# Altium footprint library chipfc_libs.PCBLIB: 283 footprints (part 11 of 18)
Each footprint in its own frame and in the unit in brackets; x right, y up, seen from the top. Pads: shape width x height; smd on the part's side, far side on the other; paste and mask are expansions set on the pad; w line width, h text height; cw(c..) or ccw(c..) is an arc to the next point about the centre after c.
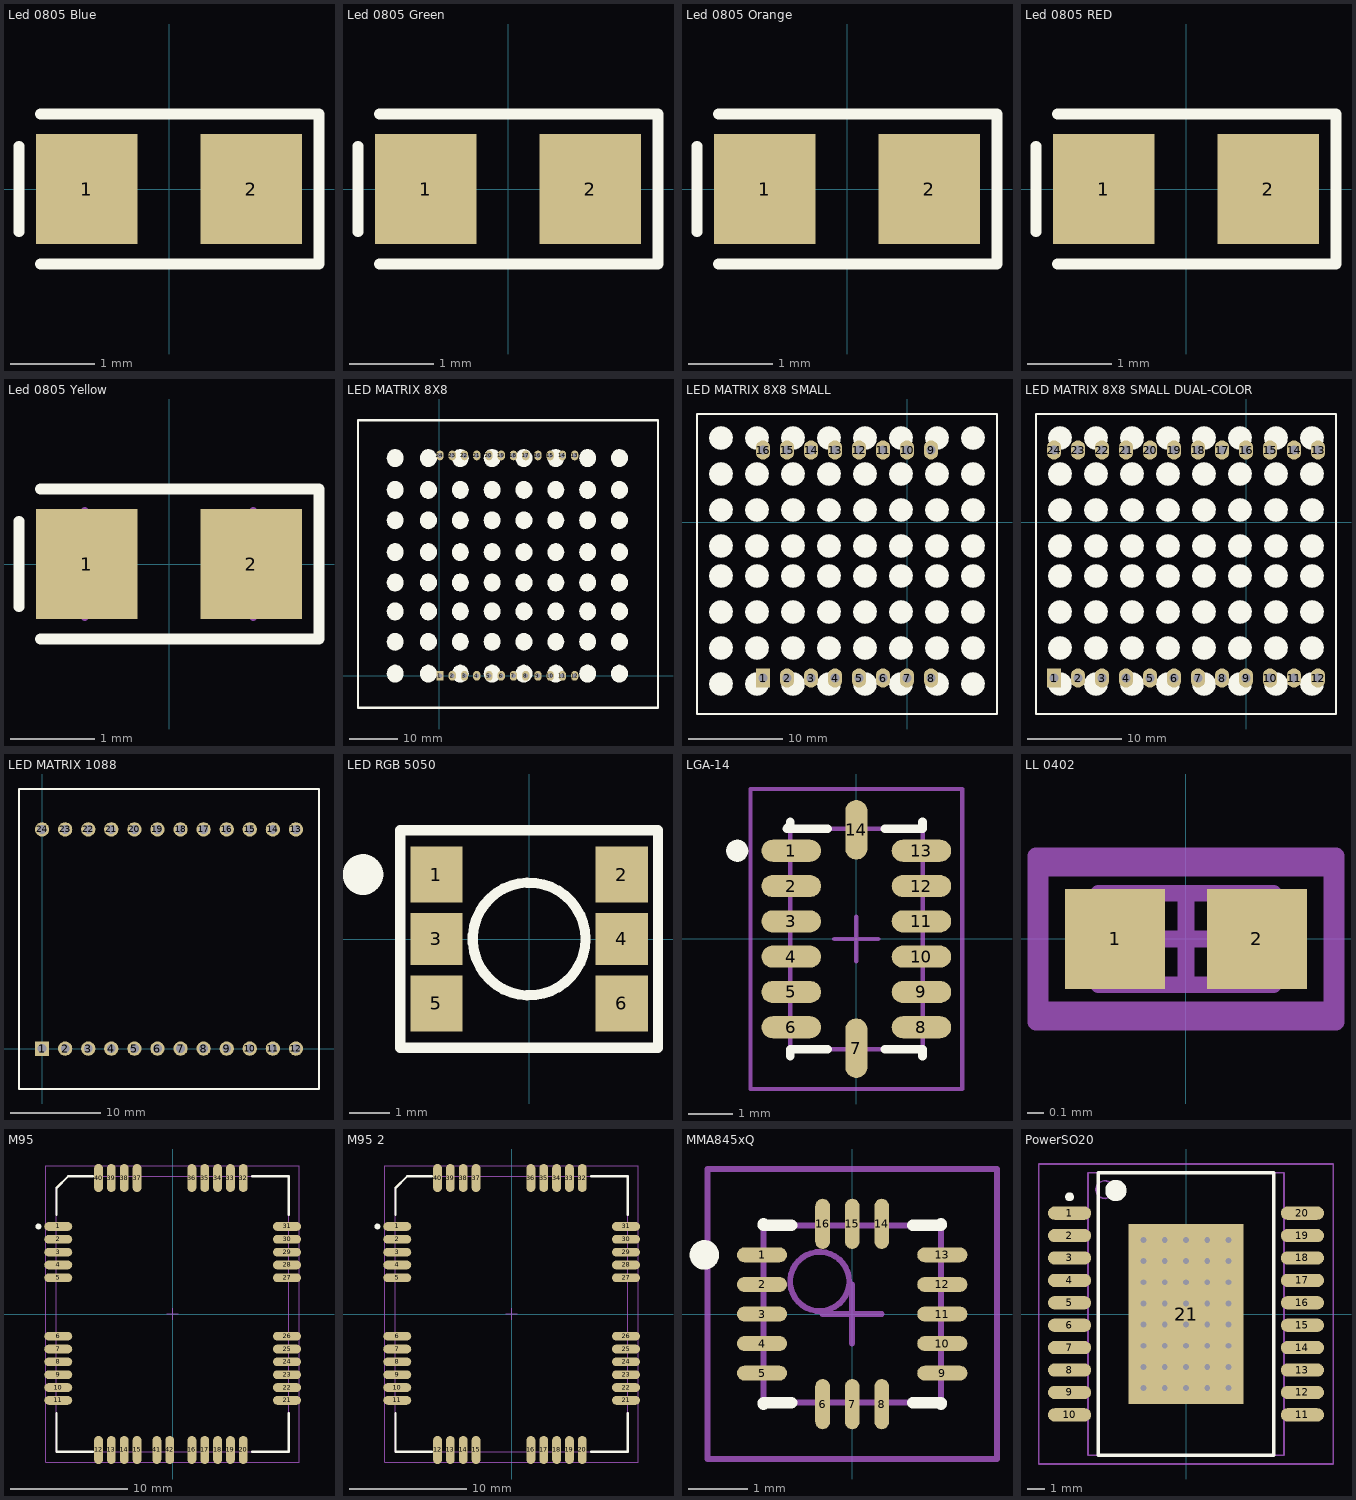
[diagram p10: the footprints below, top view; thin cyan lines are the x and y axes]

## Led 0805 Blue [mm] "Led SMD 0805"
height 1.1
pads (2):
  rect 1.2x1.3 smd: 1(-0.975,0) 2(0.975,0)
Top Overlay:
  lines w0.127: -1.778,-0.508 -1.778,0.508 ; -1.524,-0.889 1.778,-0.889 1.778,0.889 -1.524,0.889
3D body "User Library-led_0805-blue.step": height 1.1, standoff 0, extent -1.01,-0.625 1.01,0.625

## Led 0805 Green [mm] "Led SMD 0805"
height 1.1
pads (2):
  rect 1.2x1.3 smd: 1(-0.975,0) 2(0.975,0)
Top Overlay:
  lines w0.127: -1.778,-0.508 -1.778,0.508 ; -1.524,-0.889 1.778,-0.889 1.778,0.889 -1.524,0.889
3D body "User Library-led_0805-green.step": height 1.1, standoff 0, extent -1.01,-0.625 1.01,0.625

## Led 0805 Orange [mm] "Led SMD 0805"
height 1.1
pads (2):
  rect 1.2x1.3 smd: 1(-0.975,0) 2(0.975,0)
Top Overlay:
  lines w0.127: -1.778,-0.508 -1.778,0.508 ; -1.524,-0.889 1.778,-0.889 1.778,0.889 -1.524,0.889
3D body "User Library-led_0805-orange.step": height 1.1, standoff 0, extent -1.01,-0.625 1.01,0.625

## Led 0805 RED [mm] "Led SMD 0805"
height 1.1
pads (2):
  rect 1.2x1.3 smd: 1(-0.975,0) 2(0.975,0)
Top Overlay:
  lines w0.127: -1.778,-0.508 -1.778,0.508 ; -1.524,-0.889 1.778,-0.889 1.778,0.889 -1.524,0.889
3D body "User Library-led_0805-red.step": height 1.1, standoff 0, extent -1.01,-0.625 1.01,0.625

## Led 0805 Yellow [mm] "Led SMD 0805"
height 1.1
pads (2):
  rect 1.2x1.3 smd: 1(-0.975,0) 2(0.975,0)
Top Overlay:
  lines w0.127: -1.778,-0.508 -1.778,0.508 ; -1.524,-0.889 1.778,-0.889 1.778,0.889 -1.524,0.889
Mechanical 13:
  rectangle: -1,-0.625 -0.731,0.625
  lines w0.1: -1,-0.625 -1,0.625 ; 1,-0.625 1,0.625
3D body "User Library-led_0805.step": height 1.1, standoff 0, extent -1.01,-0.625 1.01,0.625

## LED MATRIX 8X8 [mil]
pads (24):
  rect 60x80 hole 39: 1(6.35,0)
  oval 60x80 hole 39: 2(106.35,0) 3(206.35,0) 4(306.35,0) 5(406.35,0) 6(506.35,0) 7(606.35,0) 8(706.35,0) 9(806.35,0) 10(906.35,0) 11(1006.35,0) 12(1106.35,0) 13(1106.35,1800) 14(1006.35,1800) 15(906.35,1800) 16(806.35,1800) 17(706.35,1800) 18(606.35,1800) 19(506.35,1800) 20(406.35,1800) 21(306.35,1800) 22(206.35,1800) 23(106.35,1800) 24(6.35,1800)
Top Overlay:
  drawing of 197 lines, arcs and shapes, not listed

## LED MATRIX 8X8 SMALL [mil]
pads (16):
  rect 60x80 hole 38: 1(-600,-650)
  oval 60x80 hole 38: 2(-500,-650) 3(-400,-650) 4(-300,-650) 5(-200,-650) 6(-100,-650) 7(0,-650) 8(100,-650) 9(100,300) 10(0,300) 11(-100,300) 12(-200,300) 13(-300,300) 14(-400,300) 15(-500,300) 16(-600,300)
Top Overlay:
  drawing of 68 lines, arcs and shapes, not listed

## LED MATRIX 8X8 SMALL DUAL-COLOR [mil]
pads (24):
  rect 60x80 hole 38: 1(-800,-650)
  oval 60x80 hole 38: 2(-700,-650) 3(-600,-650) 4(-500,-650) 5(-400,-650) 6(-300,-650) 7(-200,-650) 8(-100,-650) 9(0,-650) 10(100,-650) 11(200,-650) 12(300,-650) 13(300,300) 14(200,300) 15(100,300) 16(0,300) 17(-100,300) 18(-200,300) 19(-300,300) 20(-400,300) 21(-500,300) 22(-600,300) 23(-700,300) 24(-800,300)
Top Overlay:
  drawing of 68 lines, arcs and shapes, not listed

## LED MATRIX 1088 [mil]
pads (24):
  rect 62x62 hole 38: 1(0,0)
  round 62 hole 38: 2(100,0) 3(200,0) 4(300,0) 5(400,0) 6(500,0) 7(600,0) 8(700,0) 9(800,0) 10(900,0) 11(1000,0) 12(1100,0) 13(1100,950) 14(1000,950) 15(900,950) 16(800,950) 17(700,950) 18(600,950) 19(500,950) 20(400,950) 21(300,950) 22(200,950) 23(100,950) 24(0,950)
Top Overlay:
  lines w10: -100,-175 1200,-175 1200,1125 -100,1125 -100,-175

## LED RGB 5050 [mm]
pads (6):
  rect 1.3x1.4 smd: 1(-2.3,1.6) 2(2.3,1.6) 5(-2.3,-1.6) 6(2.3,-1.6)
  rect 1.3x1.3 smd: 3(-2.3,0) 4(2.3,0)
Top Overlay:
  circle w0.762: c-4.124,1.6 r0.124
  circle w0.254: c0,0 r1.4
  lines w0.254: -3.2,-2.7 -3.2,2.7 3.2,2.7 3.2,-2.7 -3.2,-2.7
3D body "User Library-smd_led_5050.step": height 1.6, standoff 0, extent -2.65,-2.5 2.65,2.5

## LGA-14 [mm] "LCC, 14-Pins, Body 3.0x5.0mm (max), Pitch 0.80mm, IPC Medium Density"
height 1
pads (14):
  oval 1.35x0.5 smd: 1(-1.475,2) 2(-1.475,1.2) 3(-1.475,0.4) 4(-1.475,-0.4) 5(-1.475,-1.2) 6(-1.475,-2) 8(1.475,-2) 9(1.475,-1.2) 10(1.475,-0.4) 11(1.475,0.4) 12(1.475,1.2) 13(1.475,2)
  oval 0.5x1.35 smd: 7(0,-2.475) 14(0,2.475)
Top Overlay:
  circle w0.25: c-2.7,2 r0.125
  lines w0.2: -1.5,-2.65 -1.5,-2.5 -0.65,-2.5 ; -1.5,2.65 -1.5,2.575 -1.575,2.5 -0.65,2.5 ; 0.65,-2.5 1.5,-2.5 1.5,-2.65 ; 0.65,2.5 1.5,2.5 1.5,2.65
Mechanical 13:
  lines w0.1: -1.575,2.5 -1.5,2.575 -1.5,-2.5 1.5,-2.5 1.5,2.5 -1.575,2.5
Mechanical 15:
  lines w0.1: -0.5,0 0.5,0 ; 0,-0.5 0,0.5 ; -2.4,-3.4 2.4,-3.4 2.4,3.4 -2.4,3.4 -2.4,-3.4
3D body "SW3dPS-LGA-14.STEP": height 1.03, standoff -0.4, extent -1.5,-2.5 1.5,2.5

## LL 0402 [mm] "Chip Capacitor, 2-Leads, Body 1.0x0.5mm, IPC Medium Density"
height 0.55
pads (2):
  rect 0.6x0.6 smd: 1(-0.425,0) 2(0.425,0)
Mechanical 13:
  lines w0.1: -0.525,-0.275 -0.525,0.275 0.525,0.275 0.525,-0.275 -0.525,-0.275
Mechanical 15:
  lines w0.1: -0.275,0 0.275,0 ; 0,-0.275 0,0.275 ; -0.875,-0.425 -0.875,0.425 0.875,0.425 0.875,-0.425 -0.875,-0.425
Mechanical 31:
  lines w0.1: -0.9,-0.5 -0.9,0.5 0.9,0.5 0.9,-0.5 -0.9,-0.5
3D body "User Library-Chip Inductor-L0402 (1005).step": height 0.5, standoff 0, extent -0.5,-0.3 0.5,0.3

## M95 [mm] "LCC, 54-Pins, Body 19.9x23.6mm (max), Pitch 1.10mm, IPC Medium Density"
height 2.65
pads (42):
  oval 2.4x0.75 smd: 1(-9.8,7.5) 2(-9.8,6.4) 3(-9.8,5.3) 4(-9.8,4.2) 5(-9.8,3.1) 6(-9.8,-1.9) 7(-9.8,-3) 8(-9.8,-4.1) 9(-9.8,-5.2) 10(-9.8,-6.3) 11(-9.8,-7.4) 21(9.8,-7.4) 22(9.8,-6.3) 23(9.8,-5.2) 24(9.8,-4.1) 25(9.8,-3) 26(9.8,-1.9) 27(9.8,3.1) 28(9.8,4.2) 29(9.8,5.3) 30(9.8,6.4) 31(9.8,7.5)
  oval 0.75x2.4 smd: 12(-6.35,-11.65) 13(-5.25,-11.65) 14(-4.15,-11.65) 15(-3.05,-11.65) 16(1.65,-11.65) 17(2.75,-11.65) 18(3.85,-11.65) 19(4.95,-11.65) 20(6.05,-11.65) 32(6.05,11.65) 33(4.95,11.65) 34(3.85,11.65) 35(2.75,11.65) 36(1.65,11.65) 37(-3.05,11.65) 38(-4.15,11.65) 39(-5.25,11.65) 40(-6.35,11.65) 41(-1.35,-11.65) 42(-0.25,-11.65)
Top Overlay:
  circle w0.25: c-11.5,7.5 r0.125
  lines w0.2: -9.95,-8.475 -9.95,-11.8 -6.825,-11.8 ; -9.95,8.475 -9.95,10.8 -8.95,11.8 -6.825,11.8 ; 6.825,-11.8 9.95,-11.8 9.95,-8.475 ; 6.825,11.8 9.95,11.8 9.95,8.475
Mechanical 13:
  lines w0.1: -9.95,-11.8 -9.95,10.8 -8.95,11.8 9.95,11.8 9.95,-11.8 -9.95,-11.8
Mechanical 15:
  lines w0.1: -0.5,0 0.5,0 ; 0,-0.5 0,0.5 ; -10.85,-12.7 -10.85,12.7 10.85,12.7 10.85,-12.7 -10.85,-12.7
3D body "User Library-Quectel M95.step": height 2.66, standoff 0, extent -10,-11.8 9.9,11.8

## M95 2 [mm] "LCC, 54-Pins, Body 19.9x23.6mm (max), Pitch 1.10mm, IPC Medium Density"
height 2.65
pads (40):
  oval 2.4x0.75 smd: 1(-9.8,7.5) 2(-9.8,6.4) 3(-9.8,5.3) 4(-9.8,4.2) 5(-9.8,3.1) 6(-9.8,-1.9) 7(-9.8,-3) 8(-9.8,-4.1) 9(-9.8,-5.2) 10(-9.8,-6.3) 11(-9.8,-7.4) 21(9.8,-7.4) 22(9.8,-6.3) 23(9.8,-5.2) 24(9.8,-4.1) 25(9.8,-3) 26(9.8,-1.9) 27(9.8,3.1) 28(9.8,4.2) 29(9.8,5.3) 30(9.8,6.4) 31(9.8,7.5)
  oval 0.75x2.4 smd: 12(-6.35,-11.65) 13(-5.25,-11.65) 14(-4.15,-11.65) 15(-3.05,-11.65) 16(1.65,-11.65) 17(2.75,-11.65) 18(3.85,-11.65) 19(4.95,-11.65) 20(6.05,-11.65) 32(6.05,11.65) 33(4.95,11.65) 34(3.85,11.65) 35(2.75,11.65) 36(1.65,11.65) 37(-3.05,11.65) 38(-4.15,11.65) 39(-5.25,11.65) 40(-6.35,11.65)
Top Overlay:
  circle w0.25: c-11.5,7.5 r0.125
  lines w0.2: -9.95,-8.475 -9.95,-11.8 -6.825,-11.8 ; -9.95,8.475 -9.95,10.8 -8.95,11.8 -6.825,11.8 ; 6.825,-11.8 9.95,-11.8 9.95,-8.475 ; 6.825,11.8 9.95,11.8 9.95,8.475
Mechanical 13:
  lines w0.1: -9.95,-11.8 9.95,-11.8 9.95,11.8 -8.95,11.8 -9.95,10.8 -9.95,-11.8
Mechanical 15:
  lines w0.1: -0.5,0 0.5,0 ; 0,-0.5 0,0.5 ; -10.85,-12.7 10.85,-12.7 10.85,12.7 -10.85,12.7 -10.85,-12.7
3D body "User Library-Quectel M95.step": height 2.66, standoff 0, extent -10,-11.8 9.9,11.8

## MMA845xQ [mm] "QFN, 16-Leads, Body 3.0x3.0mm (max), Pitch 0.50mm, IPC Low Density"
height 1
pads (16):
  oval 0.85x0.25 smd: 1(-1.525,1) 2(-1.525,0.5) 3(-1.525,0) 4(-1.525,-0.5) 5(-1.525,-1) 9(1.525,-1) 10(1.525,-0.5) 11(1.525,0) 12(1.525,0.5) 13(1.525,1)
  oval 0.25x0.85 smd: 6(-0.5,-1.525) 7(0,-1.525) 8(0.5,-1.525) 14(0.5,1.525) 15(0,1.525) 16(-0.5,1.525)
Top Overlay:
  circle w0.25: c-2.5,1 r0.125
  lines w0.2: -1.5,-1.525 -1.5,-1.5 -1.025,-1.5 ; -1.5,1.525 -1.5,1.5 -1.025,1.5 ; 1.025,-1.5 1.5,-1.5 1.5,-1.525 ; 1.025,1.5 1.5,1.5 1.5,1.525
Mechanical 13:
  circle w0.1: c-0.55,0.55 r0.5
  lines w0.1: -1.5,-1.5 1.5,-1.5 1.5,1.5 -1.5,1.5 -1.5,-1.5
Mechanical 15:
  lines w0.1: -0.5,0 0.5,0 ; 0,-0.5 0,0.5 ; -2.45,-2.45 2.45,-2.45 2.45,2.45 -2.45,2.45 -2.45,-2.45
3D body: height 1, standoff 0.05, extent -1.5,-1.5 1.5,1.5

## PowerSO20 [mm] "SOIC, 20-Leads, Body 16.0x11.1mm (max), Pitch 1.27mm, IPC Low Density"
height 3.6
pads (21):
  oval 2.45x0.75 smd: 1(-6.6,5.715) 2(-6.6,4.445) 3(-6.6,3.175) 4(-6.6,1.905) 5(-6.6,0.635) 6(-6.6,-0.635) 7(-6.6,-1.905) 8(-6.6,-3.175) 9(-6.6,-4.445) 10(-6.6,-5.715) 11(6.6,-5.715) 12(6.6,-4.445) 13(6.6,-3.175) 14(6.6,-1.905) 15(6.6,-0.635) 16(6.6,0.635) 17(6.6,1.905) 18(6.6,3.175) 19(6.6,4.445) 20(6.6,5.715)
  rect 6.5x10.2 smd: 21(0,0)
via 2.4,-4.2 diameter 0.66 hole 0.33
via 1.2,-4.2 diameter 0.66 hole 0.33
via 0,-4.2 diameter 0.66 hole 0.33
via -1.2,-4.2 diameter 0.66 hole 0.33
via -2.4,-4.2 diameter 0.66 hole 0.33
via 2.4,-3 diameter 0.66 hole 0.33
via 1.2,-3 diameter 0.66 hole 0.33
via 0,-3 diameter 0.66 hole 0.33
via -1.2,-3 diameter 0.66 hole 0.33
via -2.4,-3 diameter 0.66 hole 0.33
via 2.4,-1.8 diameter 0.66 hole 0.33
via 1.2,-1.8 diameter 0.66 hole 0.33
via 0,-1.8 diameter 0.66 hole 0.33
via -1.2,-1.8 diameter 0.66 hole 0.33
via -2.4,-1.8 diameter 0.66 hole 0.33
via 2.4,-0.6 diameter 0.66 hole 0.33
via 1.2,-0.6 diameter 0.66 hole 0.33
via 0,-0.6 diameter 0.66 hole 0.33
via -1.2,-0.6 diameter 0.66 hole 0.33
via -2.4,-0.6 diameter 0.66 hole 0.33
via 2.4,0.6 diameter 0.66 hole 0.33
via 1.2,0.6 diameter 0.66 hole 0.33
via 0,0.6 diameter 0.66 hole 0.33
via -1.2,0.6 diameter 0.66 hole 0.33
via -2.4,0.6 diameter 0.66 hole 0.33
via 2.4,1.8 diameter 0.66 hole 0.33
via 1.2,1.8 diameter 0.66 hole 0.33
via 0,1.8 diameter 0.66 hole 0.33
via -1.2,1.8 diameter 0.66 hole 0.33
via -2.4,1.8 diameter 0.66 hole 0.33
via 2.4,3 diameter 0.66 hole 0.33
via 1.2,3 diameter 0.66 hole 0.33
via 0,3 diameter 0.66 hole 0.33
via -1.2,3 diameter 0.66 hole 0.33
via -2.4,3 diameter 0.66 hole 0.33
via 2.4,4.2 diameter 0.66 hole 0.33
via 1.2,4.2 diameter 0.66 hole 0.33
via 0,4.2 diameter 0.66 hole 0.33
via -1.2,4.2 diameter 0.66 hole 0.33
via -2.4,4.2 diameter 0.66 hole 0.33
Top Overlay:
  circle w0.6: c-3.975,7 r0.3
  circle w0.25: c-6.6,6.64 r0.125
  lines w0.2: -4.975,-8 4.975,-8 4.975,8 -4.975,8 -4.975,-8
Mechanical 13:
  circle w0.1: c-4.6,7.05 r0.5
  lines w0.1: -5.55,-8 5.55,-8 5.55,8 -5.55,8 -5.55,-8
Mechanical 15:
  lines w0.1: -0.5,0 0.5,0 ; 0,-0.5 0,0.5 ; -8.35,-8.5 8.35,-8.5 8.35,8.5 -8.35,8.5 -8.35,-8.5
3D body "User Library-PowerSO20.STEP": height 3.6, standoff 0, extent -7.239,-8 7.161,8